# Altium footprint library eLIB.PcbLib: 206 footprints (part 10 of 13)
Each footprint in its own frame and in the unit in brackets; x right, y up, seen from the top. Pads: shape width x height; smd on the part's side, far side on the other; paste and mask are expansions set on the pad; w line width, h text height; cw(c..) or ccw(c..) is an arc to the next point about the centre after c.
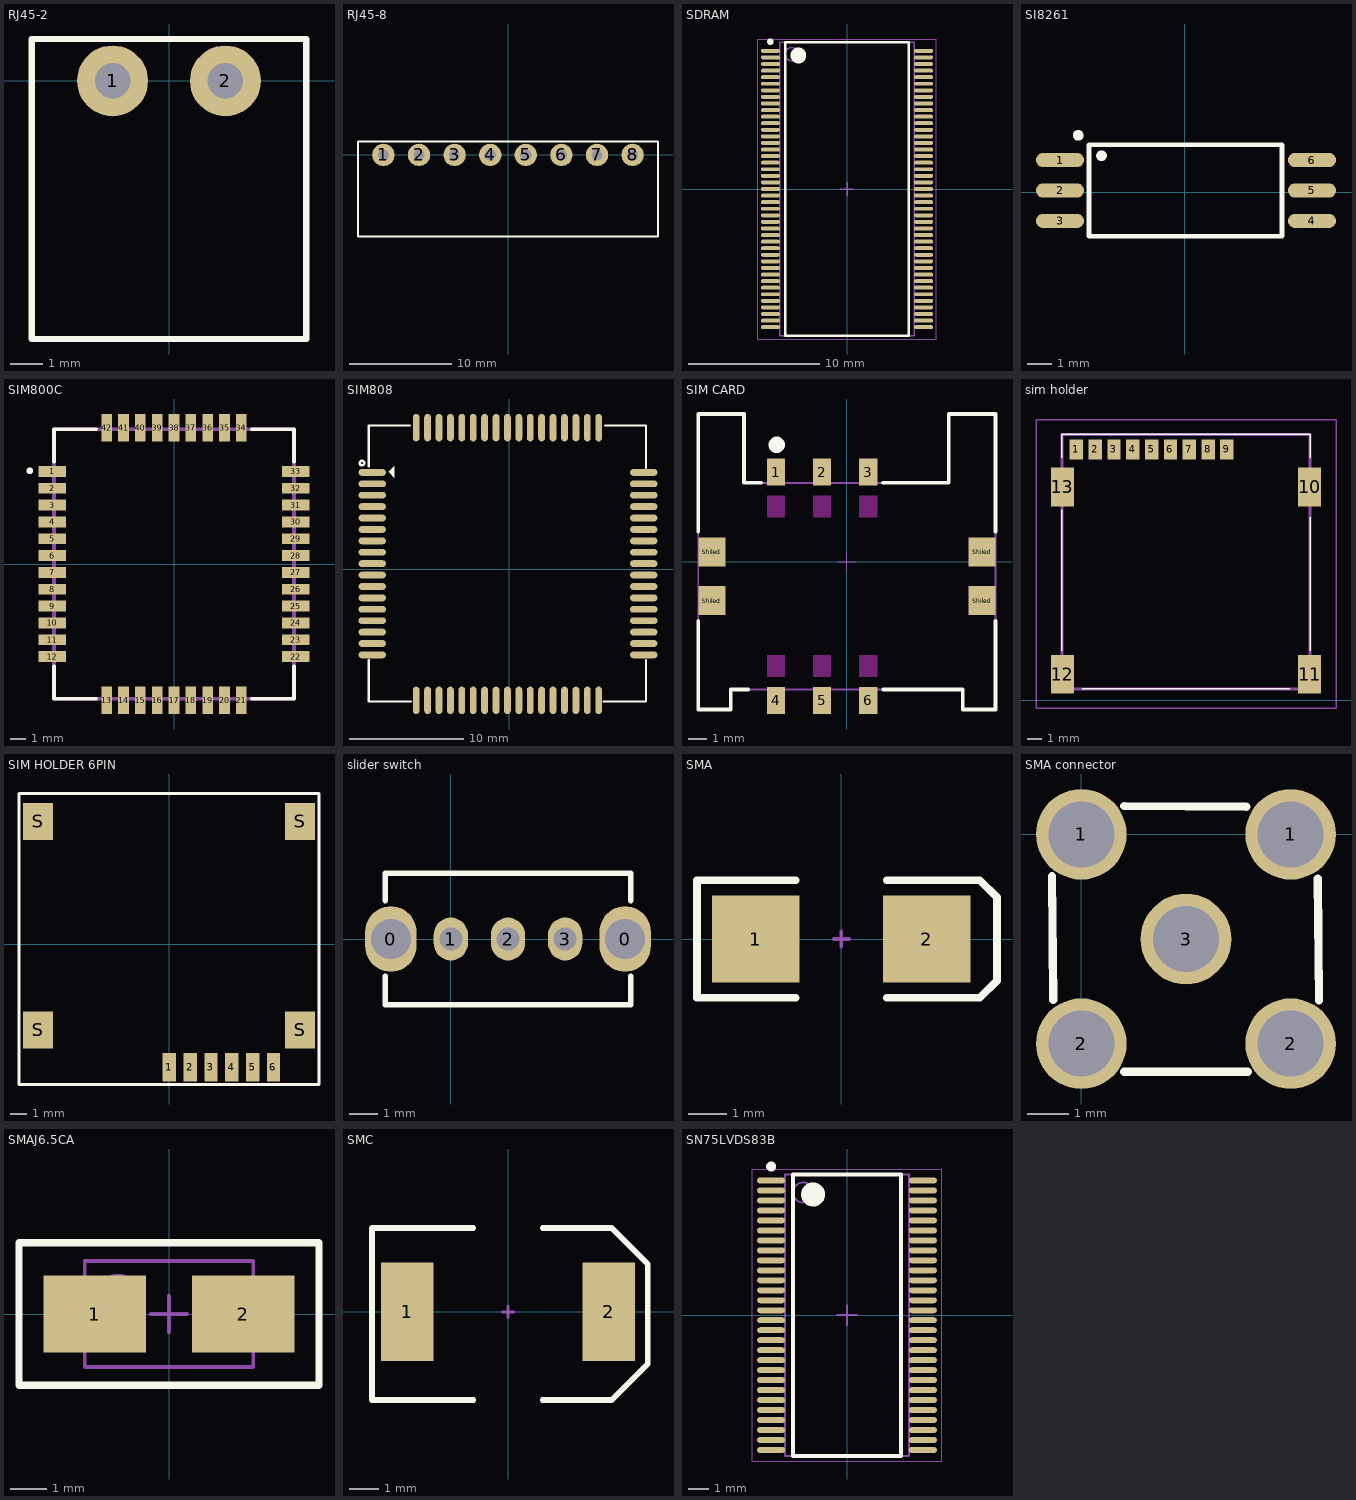
[diagram p9: the footprints below, top view; thin cyan lines are the x and y axes]

## RJ45-2 [mm] "Feed-through header - MC 1,5/ 2-G-3,5 - 1844210 screw terminal"
pads (2):
  round 2.2 hole 1.1: 1(-1.75,0) 2(1.75,0)
Top Overlay:
  lines w0.2: -4.25,-8 4.25,-8 4.25,1.3 -4.25,1.3 -4.25,-8
3D body "User Library-Terminal.STEP": height 7.45, standoff -3.2, extent -4.49,-7.99 4.52,1.31

## RJ45-8 [mm] "Feed-through header - MC 1,5/ 2-G-3,5 - 1844210 screw terminal"
pads (8):
  round 2.2 hole 1.1: 1(-12.25,0) 2(-8.75,0) 3(-5.25,0) 4(-1.75,0) 5(1.75,0) 6(5.25,0) 7(8.75,0) 8(12.25,0)
Top Overlay:
  lines w0.2: -14.75,-8 -14.75,1.3 14.75,1.3 14.75,-8 -14.75,-8
3D body "User Library-Terminal.STEP": height 7.45, standoff -3.2, extent 6.01,-7.99 15.02,1.31
3D body "User Library-Terminal.STEP": height 7.45, standoff -3.2, extent -0.99,-7.99 8.02,1.31
3D body "User Library-Terminal.STEP": height 7.45, standoff -3.2, extent -7.99,-7.99 1.02,1.31
3D body "User Library-Terminal.STEP": height 7.45, standoff -3.2, extent -14.99,-7.99 -5.98,1.31

## SDCSD [mm]

## SDRAM [mm] "TSOP, 86-Leads, Body 22.22x10.16mm, Pitch 0.50mm, MT48LC4M32B2 � 1 Meg x 32 x 4 Banks"
height 2.65
pads (86):
  oval 1.45x0.3 smd: 1(-5.825,10.5) 2(-5.825,10) 3(-5.825,9.5) 4(-5.825,9) 5(-5.825,8.5) 6(-5.825,8) 7(-5.825,7.5) 8(-5.825,7) 9(-5.825,6.5) 10(-5.825,6) 11(-5.825,5.5) 12(-5.825,5) 13(-5.825,4.5) 14(-5.825,4) 15(-5.825,3.5) 16(-5.825,3) 17(-5.825,2.5) 18(-5.825,2) 19(-5.825,1.5) 20(-5.825,1) 21(-5.825,0.5) 22(-5.825,0) 23(-5.825,-0.5) 24(-5.825,-1) 25(-5.825,-1.5) 26(-5.825,-2) 27(-5.825,-2.5) 28(-5.825,-3) 29(-5.825,-3.5) 30(-5.825,-4) 31(-5.825,-4.5) 32(-5.825,-5) 33(-5.825,-5.5) 34(-5.825,-6) 35(-5.825,-6.5) 36(-5.825,-7) 37(-5.825,-7.5) 38(-5.825,-8) 39(-5.825,-8.5) 40(-5.825,-9) 41(-5.825,-9.5) 42(-5.825,-10) 43(-5.825,-10.5) 44(5.825,-10.5) 45(5.825,-10) 46(5.825,-9.5) 47(5.825,-9) 48(5.825,-8.5) 49(5.825,-8) 50(5.825,-7.5) 51(5.825,-7) 52(5.825,-6.5) 53(5.825,-6) 54(5.825,-5.5) 55(5.825,-5) 56(5.825,-4.5) 57(5.825,-4) 58(5.825,-3.5) 59(5.825,-3) 60(5.825,-2.5) 61(5.825,-2) 62(5.825,-1.5) 63(5.825,-1) 64(5.825,-0.5) 65(5.825,0) 66(5.825,0.5) 67(5.825,1) 68(5.825,1.5) 69(5.825,2) 70(5.825,2.5) 71(5.825,3) 72(5.825,3.5) 73(5.825,4) 74(5.825,4.5) 75(5.825,5) 76(5.825,5.5) 77(5.825,6) 78(5.825,6.5) 79(5.825,7) 80(5.825,7.5) 81(5.825,8) 82(5.825,8.5) 83(5.825,9) 84(5.825,9.5) 85(5.825,10) 86(5.825,10.5)
Top Overlay:
  circle w0.25: c-5.825,11.2 r0.125
  circle w0.6: c-3.7,10.15 r0.3
  lines w0.2: -4.7,-11.15 -4.7,11.15 4.7,11.15 4.7,-11.15 -4.7,-11.15
Mechanical 13:
  circle w0.1: c-4.2,10.25 r0.5
  lines w0.1: -5.1,-11.15 -5.1,11.15 5.1,11.15 5.1,-11.15 -5.1,-11.15
Mechanical 15:
  lines w0.05: -6.8,-11.4 -6.8,11.4 6.8,11.4 6.8,-11.4 -6.8,-11.4
  lines w0.1: -0.5,0 0.5,0 ; 0,-0.5 0,0.5
3D body "SDRAM.step": height 2.75, standoff 0.1, extent -6.215,-11.15 6.215,11.15

## SI8261 [mm] "Isolated gate driver"
pads (6):
  oval 2x0.6 smd: 1(-5.2,1.34) 2(-5.2,0.07) 3(-5.2,-1.2) 4(5.3,-1.2) 5(5.3,0.07) 6(5.3,1.34)
Top Overlay:
  lines w0.2: -3.99,-1.835 4.05,-1.835 4.05,1.975 0.367,1.975 -3.99,1.975 -3.99,-1.835
  lines w0.254: -4.535,2.364 ccw(c-4.44,2.37) -4.535,2.37 ; -3.375,1.52 cw(c-3.47,1.52) -3.375,1.526
3D body "User Library-TL383.STEP": height 2.1, standoff 0, extent -5.05,-1.85 4.95,1.99

## SIM800C [mm] "GSM/GPRS Module"
pads (42):
  rect 1.8x0.7 smd: 1(-7.95,6.05) 2(-7.95,4.95) 3(-7.95,3.85) 4(-7.95,2.75) 5(-7.95,1.65) 6(-7.95,0.55) 7(-7.95,-0.55) 8(-7.95,-1.65) 9(-7.95,-2.75) 10(-7.95,-3.85) 11(-7.95,-4.95) 12(-7.95,-6.05) 22(7.95,-6.05) 23(7.95,-4.95) 24(7.95,-3.85) 25(7.95,-2.75) 26(7.95,-1.65) 27(7.95,-0.55) 28(7.95,0.55) 29(7.95,1.65) 30(7.95,2.75) 31(7.95,3.85) 32(7.95,4.95) 33(7.95,6.05)
  rect 0.7x1.8 smd: 13(-4.4,-8.9) 14(-3.3,-8.9) 15(-2.2,-8.9) 16(-1.1,-8.9) 17(0,-8.9) 18(1.1,-8.9) 19(2.2,-8.9) 20(3.3,-8.9) 21(4.4,-8.9) 34(4.4,8.9) 35(3.3,8.9) 36(2.2,8.9) 37(1.1,8.9) 38(0,8.9) 39(-1.1,8.9) 40(-2.2,8.9) 41(-3.3,8.9) 42(-4.4,8.9)
Top Overlay:
  circle w0.254: c-9.416,6.091 r0.089
  lines w0.254: -7.85,-6.7 -7.85,-8.8 -5.1,-8.8 ; -7.85,6.7 -7.85,8.8 -5.1,8.8 ; 5.1,-8.8 7.85,-8.8 7.85,-6.7 ; 5.1,8.8 7.85,8.8 7.85,6.7
Mechanical 13:
  lines w0.254: -7.85,-8.8 7.85,-8.8 7.85,8.8 -7.85,8.8 -7.85,-8.8
3D body "User Library-SIM800C-1.STEP": height 2.27, standoff -0.07, extent -7.87,-8.78 7.83,8.82

## SIM808 [mm] "SIM900_SIM808 GSM/GPRS Module"
pads (68):
  oval 2.4x0.6 smd mask+0.1: 1(-12,8.48) 2(-12,7.48) 3(-12,6.48) 4(-12,5.48) 5(-12,4.48) 6(-12,3.48) 7(-12,2.48) 8(-12,1.48) 9(-12,0.48) 10(-12,-0.52) 11(-12,-1.52) 12(-12,-2.52) 13(-12,-3.52) 14(-12,-4.52) 15(-12,-5.52) 16(-12,-6.52) 17(-12,-7.52) 35(11.8,-7.52) 36(11.8,-6.52) 37(11.8,-5.52) 38(11.8,-4.52) 39(11.8,-3.52) 40(11.8,-2.52) 41(11.8,-1.52) 42(11.8,-0.52) 43(11.8,0.48) 44(11.8,1.48) 45(11.8,2.48) 46(11.8,3.48) 47(11.8,4.48) 48(11.8,5.48) 49(11.8,6.48) 50(11.8,7.48) 51(11.8,8.48)
  oval 0.6x2.4 smd mask+0.1: 18(-8.15,-11.5) 19(-7.15,-11.5) 20(-6.15,-11.5) 21(-5.15,-11.5) 22(-4.15,-11.5) 23(-3.15,-11.5) 24(-2.15,-11.5) 25(-1.15,-11.5) 26(-0.15,-11.5) 27(0.85,-11.5) 28(1.85,-11.5) 29(2.85,-11.5) 30(3.85,-11.5) 31(4.85,-11.5) 32(5.85,-11.5) 33(6.85,-11.5) 34(7.85,-11.5) 52(7.85,12.4) 53(6.85,12.4) 54(5.85,12.4) 55(4.85,12.4) 56(3.85,12.4) 57(2.85,12.4) 58(1.85,12.4) 59(0.85,12.4) 60(-0.15,12.4) 61(-1.15,12.4) 62(-2.15,12.4) 63(-3.15,12.4) 64(-4.15,12.4) 65(-5.15,12.4) 66(-6.15,12.4) 67(-7.15,12.4) 68(-8.15,12.4)
Top Overlay:
  circle w0.2: c-12.9,9.3 r0.2
  region: -10.07,9.03 -10.07,8.03 -10.57,8.53
  lines w0.2: -12.3,-8 -12.3,-11.6 -8.6,-11.6 ; -12.3,9 -12.3,12.6 -8.7,12.6 ; 8.3,-11.6 12,-11.6 12,-8 ; 8.4,12.6 12,12.6 12,8.9
3D body "User Library-SIM808.STEP": height 2.8, standoff -0.1, extent -12.14,-11.53 11.86,12.47

## SIM CARD [mm] "SIM CARD CONNECTOR HEADER SHIELD ED 6PINS, 693010020611"
height 1.8
pads (10):
  rect 1x1.5 smd: 1(-3.9,4.95) 2(-1.36,4.95) 3(1.18,4.95) 4(-3.9,-7.65) 5(-1.36,-7.65) 6(1.18,-7.65)
  rect 1.5x1.6 smd: Shiled(-7.44,-2.15) Shiled(-7.44,0.55) Shiled(7.46,-2.15) Shiled(7.46,0.55)
Top Layer keep-out:
  rectangle: 0.68,2.45 1.68,3.65
  rectangle: -1.86,2.45 -0.86,3.65
  rectangle: -4.4,2.45 -3.4,3.65
  region: 1.68,-5.15 0.68,-5.15 0.68,-6.35 1.68,-6.35
  region: -0.86,-5.15 -1.86,-5.15 -1.86,-6.35 -0.86,-6.35
  region: -3.4,-5.15 -4.4,-5.15 -4.4,-6.35 -3.4,-6.35
Top Overlay:
  circle w0.5: c-3.87,6.45 r0.2
  lines w0.2: -8.2,-3.25 -8.2,-8.15 -6.4,-8.15 -6.4,-7.05 -5.45,-7.05 ; -8.2,1.65 -8.2,8.15 -5.67,8.15 -5.67,4.35 -4.72,4.35 ; 1.98,4.35 5.63,4.35 5.63,8.15 ; 2,-7.05 6.4,-7.05 6.4,-8.15 8.2,-8.15 8.2,-3.25 ; 8.2,1.65 8.2,8.15 5.63,8.15 ; 5.63,8.15 5.63,8.15
Mechanical 13:
  lines w0.1: 5.63,8.15 5.63,4.35 -5.67,4.35 -5.67,8.15 -8.2,8.15 -8.2,-8.15 -6.4,-8.15 -6.4,-7.05 6.4,-7.05 6.4,-8.15 8.2,-8.15 8.2,8.15 5.63,8.15 ; 5.63,8.15 5.63,8.15
Mechanical 15:
  lines w0.05: -0.5,0 0.5,0 ; 0,-0.5 0,0.5
3D body "693010020611.stp": height 1.82, standoff -0.03, extent -8.2,-8.15 8.2,8.15

## sim holder [mm]
pads (13):
  rect 0.9x1.35 smd: 1(28.754,16.939) 2(30.024,16.939) 3(31.294,16.939) 4(32.564,16.939) 5(33.834,16.939) 6(35.104,16.939) 7(36.374,16.939) 8(37.644,16.939) 9(38.914,16.939)
  rect 1.56x2.61 smd: 10(44.494,14.399) 11(44.494,1.769) 12(27.814,1.769) 13(27.814,14.399)
Top Overlay:
  lines w0.1: 27.779,3.354 27.779,12.854 ; 27.779,16.354 27.779,17.939 44.529,17.939 44.529,16.354 ; 29.154,0.769 43.154,0.769 ; 44.529,3.354 44.529,12.354
Mechanical 13:
  lines w0.2: 27.779,0.769 27.779,17.939 44.529,17.939 44.529,0.769 27.779,0.769
Mechanical 15:
  lines w0.1: 26.034,-0.536 26.034,18.939 46.274,18.939 46.274,-0.536 26.034,-0.536
3D body "User Library-Sim Holder.STEP": height 1.35, standoff 0, extent 27.9,0.7 44.3,17.9

## SIM HOLDER 6PIN [mm] "MICRI SIM HOLDER 6PIN KA306"
pads (10):
  rect 0.8x1.7 smd: 1(0.005,-7.375) 2(1.255,-7.375) 3(2.505,-7.375) 4(3.755,-7.375) 5(5.005,-7.375) 6(6.255,-7.375)
  rect 1.8x2.2 smd: S(-7.86,-5.135) S(-7.86,7.375) S(7.86,-5.135) S(7.86,7.375)
Top Overlay:
  lines w0.2: -9.01,-8.405 -9.01,9.05 8.99,9.05 8.99,-8.405 -9.01,-8.405
3D body "Sim Holder6.STEP": height 1.35, standoff 0, extent -8.25,-8.125 8.15,9.075

## slider switch [mm]
pads (5):
  oval 1.8x2.3 hole 1.4: 0(-2.1,0) 0(6.1,0)
  oval 1.2x1.5 hole 0.8: 1(0,0) 2(2,0) 3(4,0)
Top Overlay:
  lines w0.2: -2.3,-1.3 -2.3,-2.3 6.3,-2.3 6.3,-1.3 ; -2.3,1.35 -2.3,2.3 6.3,2.3 6.3,1.35
3D body "slider switch.step": height 3.55, standoff -2.55, extent -2.507,-5.16 6.507,2.14

## SMA [mm]
pads (2):
  rect 2.3x2.3 smd: 1(-2.25,0) 2(2.25,0)
Top Overlay:
  lines w0.2: -1.2,-1.55 -3.8,-1.55 -3.8,1.55 -1.2,1.55 ; 1.2,-1.55 3.65,-1.55 4.1,-1.1 4.1,1.1 3.65,1.55 1.2,1.55
Mechanical 1:
  lines w0.1: -0.2,0 0.2,0 ; 0,-0.2 0,0.2
3D body "SMAJ6.5CA.step": height 2.45, standoff 0, extent -3.3,-1.45 3.1,1.45

## SMA connector [mm] "SMA connector antenna"
pads (5):
  round 2.2 hole 1.6: 1(0,0) 1(5.08,0) 2(0,-5.08) 2(5.08,-5.08) 3(2.54,-2.54)
Top Overlay:
  lines w0.2: -0.71,-1.02 -0.68,-4.02 ; 1.04,-5.76 4.04,-5.76 ; 1.04,0.69 4,0.67 ; 5.74,-1.07 5.77,-4.03
3D body "SMA-angled.STEP": height 10.3, standoff -3.5, extent -0.96,-13.54 6.04,0.96

## SMAJ6.5CA [mm] "Transient Voltage Suppressor-Bidirectional zener diode"
height 2.45
pads (2):
  rect 2.8x2.1 smd: 1(-2.025,0) 2(2.025,0)
Top Overlay:
  lines w0.2: -4.1,-1.95 -4.1,1.95 4.1,1.95 4.1,-1.95 -4.1,-1.95
Mechanical 13:
  circle w0.1: c-1.4,0.55 r0.5
  lines w0.1: -0.5,0 0.5,0 ; 0,-0.5 0,0.5 ; -2.3,-1.45 2.3,-1.45 2.3,1.45 -2.3,1.45 -2.3,-1.45
3D body "SMAJ6.5CA.step": height 2.45, standoff 0, extent -3.2,-1.45 3.2,1.45

## SMC [mm] "SMC"
pads (2):
  rect 1.8x3.4 smd: 1(-3.481,0) 2(3.481,0)
Top Overlay:
  lines w0.2: -4.699,-3.05 -1.2,-3.05 ; -4.699,-3.047 -4.699,2.9 -1.2,2.9 ; 1.2,-3.05 3.577,-3.05 4.826,-1.801 4.826,1.628 ; 1.2,2.9 3.577,2.9 4.826,1.651 4.826,-1.778
Mechanical 1:
  lines w0.1: -0.2,0 0.2,0 ; 0,-0.2 0,0.2
3D body: height 2, standoff 0, extent -3.302,-1.905 3.429,1.905

## SN75LVDS83B [mm] "TSSOP, 56-Leads, Body 14.00x6.10mm, Pitch 0.50mm, IPC Medium Density"
height 1.2
pads (56):
  oval 1.4x0.3 smd: 1(-3.8,6.75) 2(-3.8,6.25) 3(-3.8,5.75) 4(-3.8,5.25) 5(-3.8,4.75) 6(-3.8,4.25) 7(-3.8,3.75) 8(-3.8,3.25) 9(-3.8,2.75) 10(-3.8,2.25) 11(-3.8,1.75) 12(-3.8,1.25) 13(-3.8,0.75) 14(-3.8,0.25) 15(-3.8,-0.25) 16(-3.8,-0.75) 17(-3.8,-1.25) 18(-3.8,-1.75) 19(-3.8,-2.25) 20(-3.8,-2.75) 21(-3.8,-3.25) 22(-3.8,-3.75) 23(-3.8,-4.25) 24(-3.8,-4.75) 25(-3.8,-5.25) 26(-3.8,-5.75) 27(-3.8,-6.25) 28(-3.8,-6.75) 29(3.8,-6.75) 30(3.8,-6.25) 31(3.8,-5.75) 32(3.8,-5.25) 33(3.8,-4.75) 34(3.8,-4.25) 35(3.8,-3.75) 36(3.8,-3.25) 37(3.8,-2.75) 38(3.8,-2.25) 39(3.8,-1.75) 40(3.8,-1.25) 41(3.8,-0.75) 42(3.8,-0.25) 43(3.8,0.25) 44(3.8,0.75) 45(3.8,1.25) 46(3.8,1.75) 47(3.8,2.25) 48(3.8,2.75) 49(3.8,3.25) 50(3.8,3.75) 51(3.8,4.25) 52(3.8,4.75) 53(3.8,5.25) 54(3.8,5.75) 55(3.8,6.25) 56(3.8,6.75)
Top Overlay:
  circle w0.6: c-1.7,6.05 r0.3
  circle w0.25: c-3.8,7.45 r0.125
  lines w0.2: -2.7,-7.05 2.7,-7.05 2.7,7.05 -2.7,7.05 -2.7,-7.05
Mechanical 13:
  circle w0.1: c-2.2,6.15 r0.5
  lines w0.1: -3.1,-7.05 3.1,-7.05 3.1,7.05 -3.1,7.05 -3.1,-7.05
Mechanical 15:
  lines w0.05: -4.75,-7.3 4.75,-7.3 4.75,7.3 -4.75,7.3 -4.75,-7.3
  lines w0.1: -0.5,0 0.5,0 ; 0,-0.5 0,0.5
3D body "SN75LVDS83B.step": height 1.2, standoff 0, extent -4.05,-7.05 4.05,7.05